# Altium schematic symbol library LATTICEPLDS_Library.SchLib: 291 symbols (part 3 of 32) (continued)
## LC5256/5512/5768-F256 (continued)

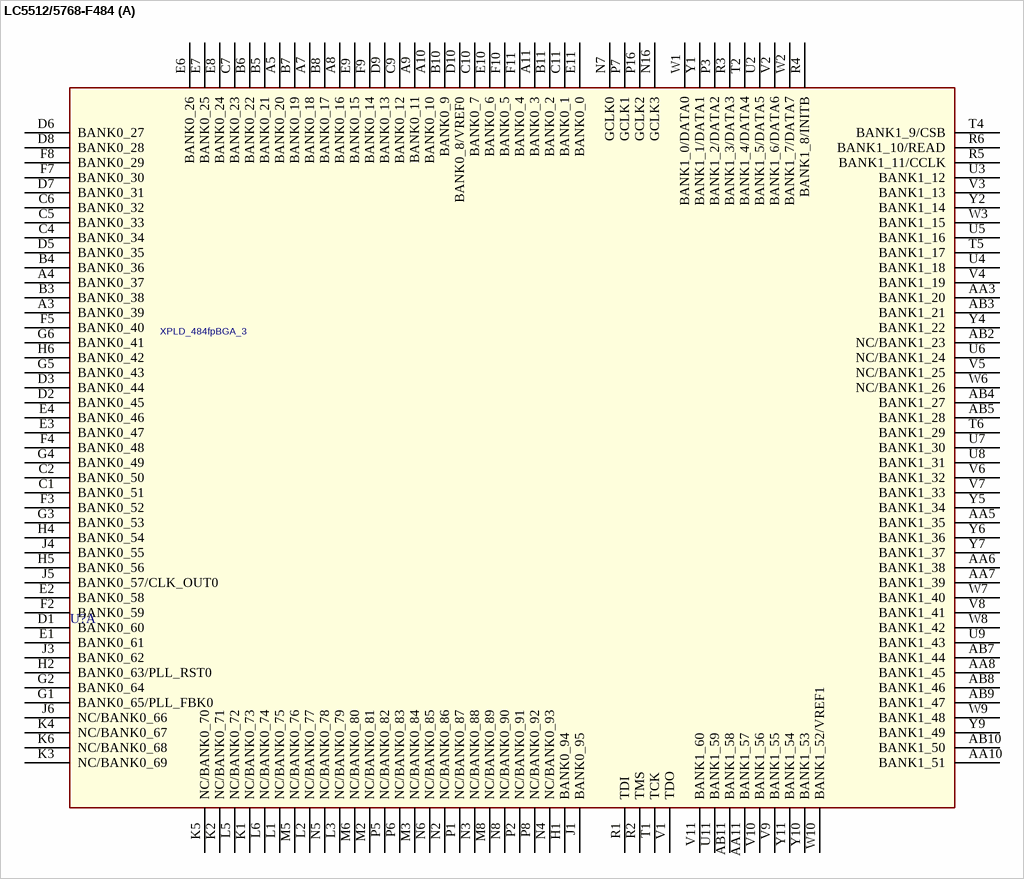
[diagram p31: symbol LC5512/5768-F484]

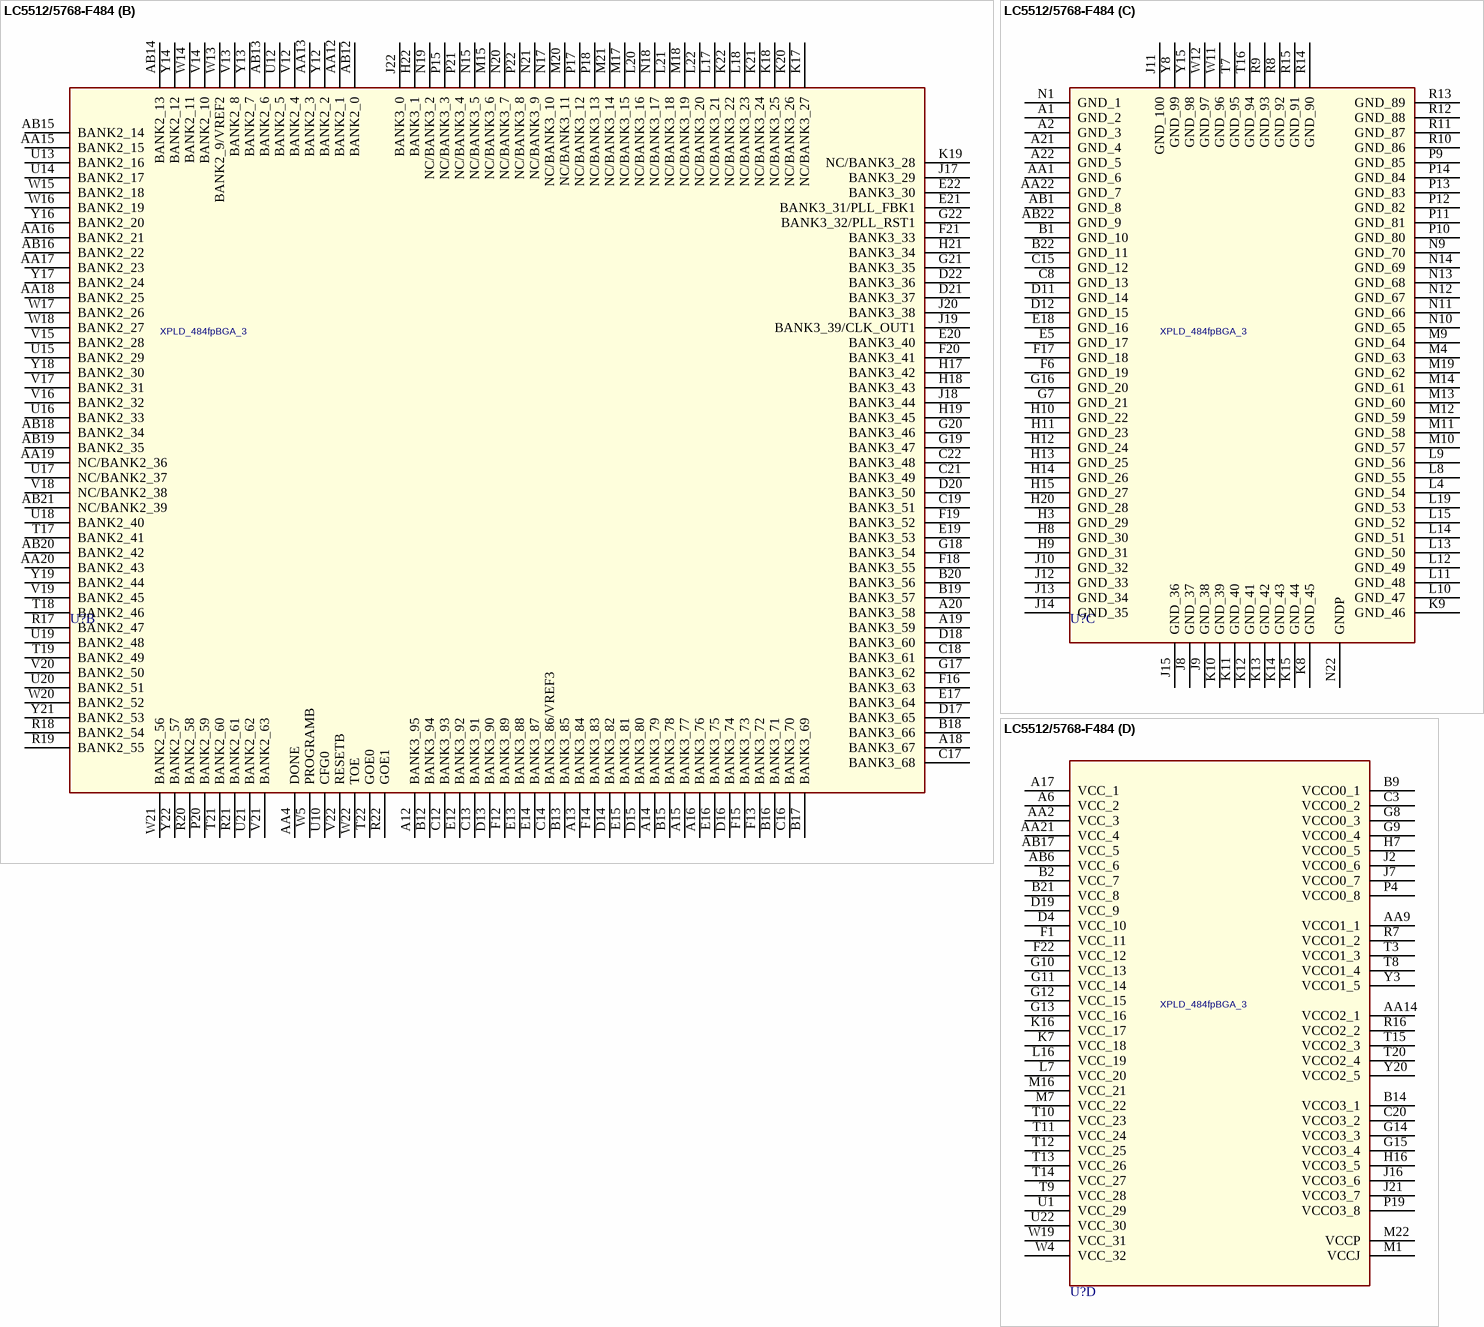
[diagram p32: symbol LC5512/5768-F484]

## LC5512/5768-F484
designator U?, comment XPLD_484fpBGA_3
part A pins: A3 BANK0_39 (hiz), A4 BANK0_37 (hiz), A5 BANK0_20 (hiz), A7 BANK0_18 (hiz), A8 BANK0_16 (hiz), A9 BANK0_11 (hiz), A10 BANK0_10 (hiz), A11 BANK0_3 (hiz), AA3 BANK1_20 (hiz), AA5 BANK1_35 (hiz), AA6 BANK1_38 (hiz), AA7 BANK1_39 (hiz), AA8 BANK1_45 (hiz), AA10 BANK1_51 (hiz), AA11 BANK1_57 (hiz), AB2 NC/BANK1_23 (hiz), AB3 BANK1_21 (hiz), AB4 BANK1_27 (hiz), AB5 BANK1_28 (hiz), AB7 BANK1_44 (hiz), AB8 BANK1_46 (hiz), AB9 BANK1_47 (hiz), AB10 BANK1_50 (hiz), AB11 BANK1_58 (hiz), B3 BANK0_38 (hiz), B4 BANK0_36 (hiz), B5 BANK0_21 (hiz), B6 BANK0_22 (hiz), B7 BANK0_19 (hiz), B8 BANK0_17 (hiz), B10 BANK0_9 (hiz), B11 BANK0_2 (hiz), C1 BANK0_51 (hiz), C2 BANK0_50 (hiz), C4 BANK0_34 (hiz), C5 BANK0_33 (hiz), C6 BANK0_32 (hiz), C7 BANK0_23 (hiz), C9 BANK0_12 (hiz), C10 BANK0_7 (hiz), C11 BANK0_1 (hiz), D1 BANK0_60 (hiz), D2 BANK0_45 (hiz), D3 BANK0_44 (hiz), D5 BANK0_35 (hiz), D6 BANK0_27 (hiz), D7 BANK0_31 (hiz), D8 BANK0_28 (hiz), D9 BANK0_13 (hiz), D10 BANK0_8/VREF0 (hiz), E1 BANK0_61 (hiz), E2 BANK0_58 (hiz), E3 BANK0_47 (hiz), E4 BANK0_46 (hiz), E6 BANK0_26 (hiz), E7 BANK0_25 (hiz), E8 BANK0_24 (hiz), E9 BANK0_15 (hiz), E10 BANK0_6 (hiz), E11 BANK0_0 (hiz), F2 BANK0_59 (hiz), F3 BANK0_52 (hiz), F4 BANK0_48 (hiz), F5 BANK0_40 (hiz), F7 BANK0_30 (hiz), F8 BANK0_29 (hiz), F9 BANK0_14 (hiz), F10 BANK0_5 (hiz), F11 BANK0_4 (hiz), G1 BANK0_65/PLL_FBK0 (hiz), G2 BANK0_64 (hiz), G3 BANK0_53 (hiz), G4 BANK0_49 (hiz), G5 BANK0_43 (hiz), G6 BANK0_41 (hiz), H1 BANK0_94 (hiz), H2 BANK0_63/PLL_RST0 (hiz), H4 BANK0_54 (hiz), H5 BANK0_56 (hiz), H6 BANK0_42 (hiz), J1 BANK0_95 (hiz), J3 BANK0_62 (hiz), J4 BANK0_55 (hiz), J5 BANK0_57/CLK_OUT0 (hiz), J6 NC/BANK0_66 (hiz), K1 NC/BANK0_73 (hiz), K2 NC/BANK0_71 (hiz), K3 NC/BANK0_69 (hiz), K4 NC/BANK0_67 (hiz), K5 NC/BANK0_70 (hiz), K6 NC/BANK0_68 (hiz), L1 NC/BANK0_75 (hiz), L2 NC/BANK0_77 (hiz), L3 NC/BANK0_79 (hiz), L5 NC/BANK0_72 (hiz), L6 NC/BANK0_74 (hiz), M2 NC/BANK0_81 (hiz), M3 NC/BANK0_84 (hiz), M5 NC/BANK0_76 (hiz), M6 NC/BANK0_80 (hiz), M8 NC/BANK0_89 (hiz), N2 NC/BANK0_86 (hiz), N3 NC/BANK0_88 (hiz), N4 NC/BANK0_93 (hiz), N5 NC/BANK0_78 (hiz), N6 NC/BANK0_85 (hiz), N7 GCLK0 (hiz), N8 NC/BANK0_90 (hiz), N16 GCLK3 (hiz), P1 NC/BANK0_87 (hiz), P2 NC/BANK0_91 (hiz), P3 BANK1_2/DATA2 (hiz), P5 NC/BANK0_82 (hiz), P6 NC/BANK0_83 (hiz), P7 GCLK1 (hiz), P8 NC/BANK0_92 (hiz), P16 GCLK2 (hiz), R1 TDI (hiz), R2 TMS (hiz), R3 BANK1_3/DATA3 (hiz), R4 BANK1_8/INITB (hiz), R5 BANK1_11/CCLK (hiz), R6 BANK1_10/READ (hiz), T1 TCK (hiz), T2 BANK1_4/DATA4 (hiz), T4 BANK1_9/CSB (hiz), T5 BANK1_17 (hiz), T6 BANK1_29 (hiz), U2 BANK1_5/DATA5 (hiz), U3 BANK1_12 (hiz), U4 BANK1_18 (hiz), U5 BANK1_16 (hiz), U6 NC/BANK1_24 (hiz), U7 BANK1_30 (hiz), U8 BANK1_31 (hiz), U9 BANK1_43 (hiz), U11 BANK1_59 (hiz), V1 TDO (hiz), V2 BANK1_6/DATA6 (hiz), V3 BANK1_13 (hiz), V4 BANK1_19 (hiz), V5 NC/BANK1_25 (hiz), V6 BANK1_32 (hiz), V7 BANK1_33 (hiz), V8 BANK1_41 (hiz), V9 BANK1_55 (hiz), V10 BANK1_56 (hiz), V11 BANK1_60 (hiz), W1 BANK1_0/DATA0 (hiz), W2 BANK1_7/DATA7 (hiz), W3 BANK1_15 (hiz), W6 NC/BANK1_26 (hiz), W7 BANK1_40 (hiz), W8 BANK1_42 (hiz), W9 BANK1_48 (hiz), W10 BANK1_52/VREF1 (hiz), Y1 BANK1_1/DATA1 (hiz), Y2 BANK1_14 (hiz), Y4 BANK1_22 (hiz), Y5 BANK1_34 (hiz), Y6 BANK1_36 (hiz), Y7 BANK1_37 (hiz), Y9 BANK1_49 (hiz), Y10 BANK1_53 (hiz), Y11 BANK1_54 (hiz)
part B pins: A12 BANK3_95 (hiz), A13 BANK3_84 (hiz), A14 BANK3_79 (hiz), A15 BANK3_77 (hiz), A16 BANK3_76 (hiz), A18 BANK3_67 (hiz), A19 BANK3_59 (hiz), A20 BANK3_58 (hiz), AA4 DONE (hiz), AA12 BANK2_1 (hiz), AA13 BANK2_3 (hiz), AA15 BANK2_15 (hiz), AA16 BANK2_21 (hiz), AA17 BANK2_23 (hiz), AA18 BANK2_25 (hiz), AA19 NC/BANK2_36 (hiz), AA20 BANK2_43 (hiz), AB12 BANK2_0 (hiz), AB13 BANK2_6 (hiz), AB14 BANK2_13 (hiz), AB15 BANK2_14 (hiz), AB16 BANK2_22 (hiz), AB18 BANK2_34 (hiz), AB19 BANK2_35 (hiz), AB20 BANK2_42 (hiz), AB21 NC/BANK2_39 (hiz), B12 BANK3_94 (hiz), B13 BANK3_85 (hiz), B15 BANK3_78 (hiz), B16 BANK3_71 (hiz), B17 BANK3_69 (hiz), B18 BANK3_66 (hiz), B19 BANK3_57 (hiz), B20 BANK3_56 (hiz), C12 BANK3_93 (hiz), C13 BANK3_91 (hiz), C14 BANK3_86/VREF3 (hiz), C16 BANK3_70 (hiz), C17 BANK3_68 (hiz), C18 BANK3_61 (hiz), C19 BANK3_51 (hiz), C21 BANK3_49 (hiz), C22 BANK3_48 (hiz), D13 BANK3_90 (hiz), D14 BANK3_82 (hiz), D15 BANK3_80 (hiz), D16 BANK3_74 (hiz), D17 BANK3_65 (hiz), D18 BANK3_60 (hiz), D20 BANK3_50 (hiz), D21 BANK3_37 (hiz), D22 BANK3_36 (hiz), E12 BANK3_92 (hiz), E13 BANK3_88 (hiz), E14 BANK3_87 (hiz), E15 BANK3_81 (hiz), E16 BANK3_75 (hiz), E17 BANK3_64 (hiz), E19 BANK3_53 (hiz), E20 BANK3_40 (hiz), E21 BANK3_31/PLL_FBK1 (hiz), E22 BANK3_30 (hiz), F12 BANK3_89 (hiz), F13 BANK3_72 (hiz), F14 BANK3_83 (hiz), F15 BANK3_73 (hiz), F16 BANK3_63 (hiz), F18 BANK3_55 (hiz), F19 BANK3_52 (hiz), F20 BANK3_41 (hiz), F21 BANK3_33 (hiz), G17 BANK3_62 (hiz), G18 BANK3_54 (hiz), G19 BANK3_47 (hiz), G20 BANK3_46 (hiz), G21 BANK3_35 (hiz), G22 BANK3_32/PLL_RST1 (hiz), H17 BANK3_42 (hiz), H18 BANK3_43 (hiz), H19 BANK3_45 (hiz), H21 BANK3_34 (hiz), H22 BANK3_1 (hiz), J17 BANK3_29 (hiz), J18 BANK3_44 (hiz), J19 BANK3_39/CLK_OUT1 (hiz), J20 BANK3_38 (hiz), J22 BANK3_0 (hiz), K17 NC/BANK3_27 (hiz), K18 NC/BANK3_25 (hiz), K19 NC/BANK3_28 (hiz), K20 NC/BANK3_26 (hiz), K21 NC/BANK3_24 (hiz), K22 NC/BANK3_22 (hiz), L17 NC/BANK3_21 (hiz), L18 NC/BANK3_23 (hiz), L20 NC/BANK3_16 (hiz), L21 NC/BANK3_18 (hiz), L22 NC/BANK3_20 (hiz), M15 NC/BANK3_6 (hiz), M17 NC/BANK3_15 (hiz), M18 NC/BANK3_19 (hiz), M20 NC/BANK3_11 (hiz), M21 NC/BANK3_14 (hiz), N15 NC/BANK3_5 (hiz), N17 NC/BANK3_10 (hiz), N18 NC/BANK3_17 (hiz), N19 NC/BANK3_2 (hiz), N20 NC/BANK3_7 (hiz), N21 NC/BANK3_9 (hiz), P15 NC/BANK3_3 (hiz), P17 NC/BANK3_12 (hiz), P18 NC/BANK3_13 (hiz), P20 BANK2_59 (hiz), P21 NC/BANK3_4 (hiz), P22 NC/BANK3_8 (hiz), R17 BANK2_47 (hiz), R18 BANK2_54 (hiz), R19 BANK2_55 (hiz), R20 BANK2_58 (hiz), R21 BANK2_61 (hiz), R22 GOE1 (hiz), T17 BANK2_41 (hiz), T18 BANK2_46 (hiz), T19 BANK2_49 (hiz), T21 BANK2_60 (hiz), T22 GOE0 (hiz), U10 CFG0 (hiz), U12 BANK2_5 (hiz), U13 BANK2_16 (hiz), U14 BANK2_17 (hiz), U15 BANK2_29 (hiz), U16 BANK2_33 (hiz), U17 NC/BANK2_37 (hiz), U18 BANK2_40 (hiz), U19 BANK2_48 (hiz), U20 BANK2_51 (hiz), U21 BANK2_62 (hiz), V12 BANK2_4 (hiz), V13 BANK2_8 (hiz), V14 BANK2_10 (hiz), V15 BANK2_28 (hiz), V16 BANK2_32 (hiz), V17 BANK2_31 (hiz), V18 NC/BANK2_38 (hiz), V19 BANK2_45 (hiz), V20 BANK2_50 (hiz), V21 BANK2_63 (hiz), V22 RESETB (hiz), W5 PROGRAMB (hiz), W13 BANK2_9/VREF2 (hiz), W14 BANK2_11 (hiz), W15 BANK2_18 (hiz), W16 BANK2_19 (hiz), W17 BANK2_26 (hiz), W18 BANK2_27 (hiz), W20 BANK2_52 (hiz), W21 BANK2_56 (hiz), W22 TOE (hiz), Y12 BANK2_2 (hiz), Y13 BANK2_7 (hiz), Y14 BANK2_12 (hiz), Y16 BANK2_20 (hiz), Y17 BANK2_24 (hiz), Y18 BANK2_30 (hiz), Y19 BANK2_44 (hiz), Y21 BANK2_53 (hiz), Y22 BANK2_57 (hiz)
part C pins: A1 GND_2 (power), A2 GND_3 (power), A21 GND_4 (power), A22 GND_5 (power), AA1 GND_6 (power), AA22 GND_7 (power), AB1 GND_8 (power), AB22 GND_9 (power), B1 GND_10 (power), B22 GND_11 (power), C8 GND_13 (power), C15 GND_12 (power), D11 GND_14 (power), D12 GND_15 (power), E5 GND_17 (power), E18 GND_16 (power), F6 GND_19 (power), F17 GND_18 (power), G7 GND_21 (power), G16 GND_20 (power), H3 GND_29 (power), H8 GND_30 (power), H9 GND_31 (power), H10 GND_22 (power), H11 GND_23 (power), H12 GND_24 (power), H13 GND_25 (power), H14 GND_26 (power), H15 GND_27 (power), H20 GND_28 (power), J8 GND_37 (power), J9 GND_38 (power), J10 GND_32 (power), J11 GND_100 (power), J12 GND_33 (power), J13 GND_34 (power), J14 GND_35 (power), J15 GND_36 (power), K8 GND_45 (power), K9 GND_46 (power), K10 GND_39 (power), K11 GND_40 (power), K12 GND_41 (power), K13 GND_42 (power), K14 GND_43 (power), K15 GND_44 (power), L4 GND_54 (power), L8 GND_55 (power), L9 GND_56 (power), L10 GND_47 (power), L11 GND_48 (power), L12 GND_49 (power), L13 GND_50 (power), L14 GND_51 (power), L15 GND_52 (power), L19 GND_53 (power), M4 GND_63 (power), M9 GND_64 (power), M10 GND_57 (power), M11 GND_58 (power), M12 GND_59 (power), M13 GND_60 (power), M14 GND_61 (power), M19 GND_62 (power), N1 GND_1 (power), N9 GND_70 (power), N10 GND_65 (power), N11 GND_66 (power), N12 GND_67 (power), N13 GND_68 (power), N14 GND_69 (power), N22 GNDP (power), P9 GND_85 (power), P10 GND_80 (power), P11 GND_81 (power), P12 GND_82 (power), P13 GND_83 (power), P14 GND_84 (power), R8 GND_92 (power), R9 GND_93 (power), R10 GND_86 (power), R11 GND_87 (power), R12 GND_88 (power), R13 GND_89 (power), R14 GND_90 (power), R15 GND_91 (power), T7 GND_95 (power), T16 GND_94 (power), W11 GND_96 (power), W12 GND_97 (power), Y8 GND_99 (power), Y15 GND_98 (power)
part D pins: A6 VCC_2 (power), A17 VCC_1 (power), AA2 VCC_3 (power), AA9 VCCO1_1 (power), AA14 VCCO2_1 (power), AA21 VCC_4 (power), AB6 VCC_6 (power), AB17 VCC_5 (power), B2 VCC_7 (power), B9 VCCO0_1 (power), B14 VCCO3_1 (power), B21 VCC_8 (power), C3 VCCO0_2 (power), C20 VCCO3_2 (power), D4 VCC_10 (power), D19 VCC_9 (power), F1 VCC_11 (power), F22 VCC_12 (power), G8 VCCO0_3 (power), G9 VCCO0_4 (power), G10 VCC_13 (power), G11 VCC_14 (power), G12 VCC_15 (power), G13 VCC_16 (power), G14 VCCO3_3 (power), G15 VCCO3_4 (power), H7 VCCO0_5 (power), H16 VCCO3_5 (power), J2 VCCO0_6 (power), J7 VCCO0_7 (power), J16 VCCO3_6 (power), J21 VCCO3_7 (power), K7 VCC_18 (power), K16 VCC_17 (power), L7 VCC_20 (power), L16 VCC_19 (power), M1 VCCJ (power), M7 VCC_22 (power), M16 VCC_21 (power), M22 VCCP (power), P4 VCCO0_8 (power), P19 VCCO3_8 (power), R7 VCCO1_2 (power), R16 VCCO2_2 (power), T3 VCCO1_3 (power), T8 VCCO1_4 (power), T9 VCC_28 (power), T10 VCC_23 (power), T11 VCC_24 (power), T12 VCC_25 (power), T13 VCC_26 (power), T14 VCC_27 (power), T15 VCCO2_3 (power), T20 VCCO2_4 (power), U1 VCC_29 (power), U22 VCC_30 (power), W4 VCC_32 (power), W19 VCC_31 (power), Y3 VCCO1_5 (power), Y20 VCCO2_5 (power)

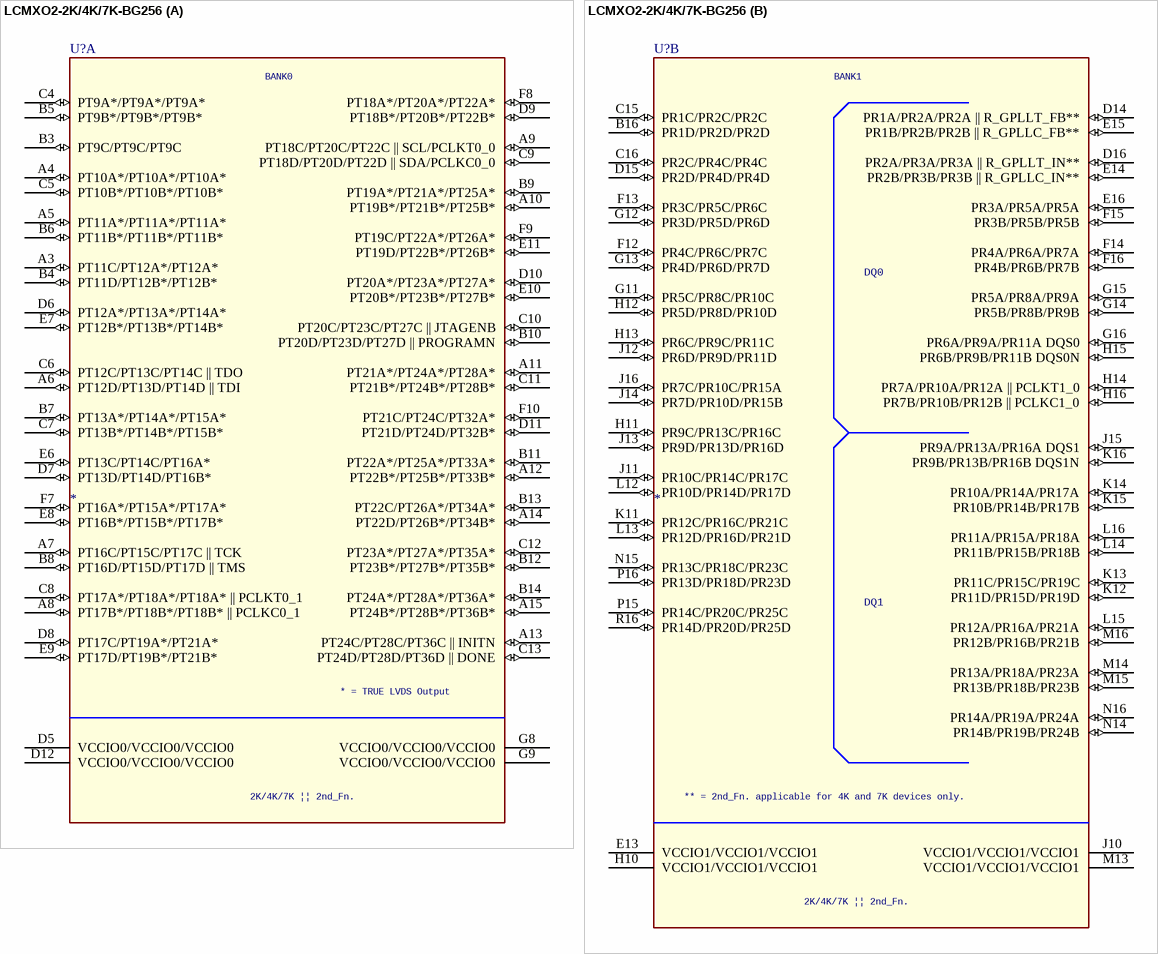
[diagram p33: symbol LCMXO2-2K/4K/7K-BG256]

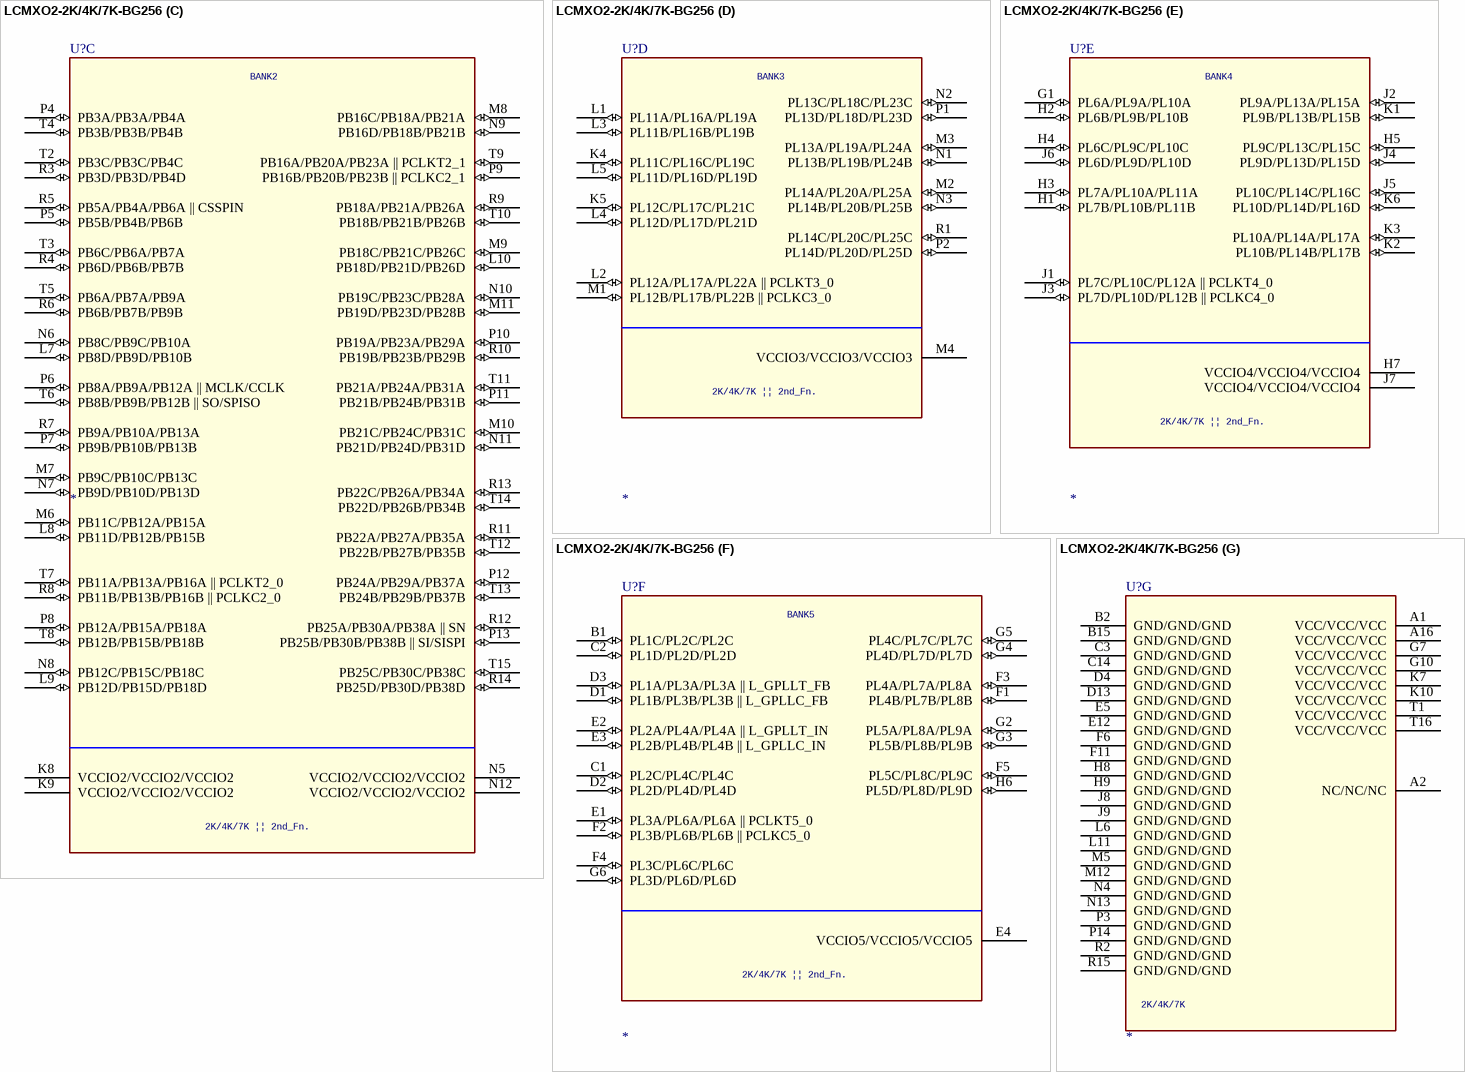
[diagram p34: symbol LCMXO2-2K/4K/7K-BG256]

## LCMXO2-2K/4K/7K-BG256
designator U?
SPLIT_INST: TRUE; SWAP_INFO: (S1+S2+S3+S4+S5+S6+S7)
part A pins: A3 PT11C/PT12A*/PT12A* (io), A4 PT10A*/PT10A*/PT10A* (io), A5 PT11A*/PT11A*/PT11A* (io), A6 PT12D/PT13D/PT14D || TDI (io), A7 PT16C/PT15C/PT17C || TCK (io), A8 PT17B*/PT18B*/PT18B* || PCLKC0_1 (io), A9 PT18C/PT20C/PT22C || SCL/PCLKT0_0 (io), A10 PT19B*/PT21B*/PT25B* (io), A11 PT21A*/PT24A*/PT28A* (io), A12 PT22B*/PT25B*/PT33B* (io), A13 PT24C/PT28C/PT36C || INITN (io), A14 PT22D/PT26B*/PT34B* (io), A15 PT24B*/PT28B*/PT36B* (io), B3 PT9C/PT9C/PT9C (io), B4 PT11D/PT12B*/PT12B* (io), B5 PT9B*/PT9B*/PT9B* (io), B6 PT11B*/PT11B*/PT11B* (io), B7 PT13A*/PT14A*/PT15A* (io), B8 PT16D/PT15D/PT17D || TMS (io), B9 PT19A*/PT21A*/PT25A* (io), B10 PT20D/PT23D/PT27D || PROGRAMN (io), B11 PT22A*/PT25A*/PT33A* (io), B12 PT23B*/PT27B*/PT35B* (io), B13 PT22C/PT26A*/PT34A* (io), B14 PT24A*/PT28A*/PT36A* (io), C4 PT9A*/PT9A*/PT9A* (io), C5 PT10B*/PT10B*/PT10B* (io), C6 PT12C/PT13C/PT14C || TDO (io), C7 PT13B*/PT14B*/PT15B* (io), C8 PT17A*/PT18A*/PT18A* || PCLKT0_1 (io), C9 PT18D/PT20D/PT22D || SDA/PCLKC0_0 (io), C10 PT20C/PT23C/PT27C || JTAGENB (io), C11 PT21B*/PT24B*/PT28B* (io), C12 PT23A*/PT27A*/PT35A* (io), C13 PT24D/PT28D/PT36D || DONE (io), D5 VCCIO0/VCCIO0/VCCIO0 (power), D6 PT12A*/PT13A*/PT14A* (io), D7 PT13D/PT14D/PT16B* (io), D8 PT17C/PT19A*/PT21A* (io), D9 PT18B*/PT20B*/PT22B* (io), D10 PT20A*/PT23A*/PT27A* (io), D11 PT21D/PT24D/PT32B* (io), D12 VCCIO0/VCCIO0/VCCIO0 (power), E6 PT13C/PT14C/PT16A* (io), E7 PT12B*/PT13B*/PT14B* (io), E8 PT16B*/PT15B*/PT17B* (io), E9 PT17D/PT19B*/PT21B* (io), E10 PT20B*/PT23B*/PT27B* (io), E11 PT19D/PT22B*/PT26B* (io), F7 PT16A*/PT15A*/PT17A* (io), F8 PT18A*/PT20A*/PT22A* (io), F9 PT19C/PT22A*/PT26A* (io), F10 PT21C/PT24C/PT32A* (io), G8 VCCIO0/VCCIO0/VCCIO0 (power), G9 VCCIO0/VCCIO0/VCCIO0 (power)
part B pins: B16 PR1D/PR2D/PR2D (io), C15 PR1C/PR2C/PR2C (io), C16 PR2C/PR4C/PR4C (io), D14 PR1A/PR2A/PR2A || R_GPLLT_FB** (io), D15 PR2D/PR4D/PR4D (io), D16 PR2A/PR3A/PR3A || R_GPLLT_IN** (io), E13 VCCIO1/VCCIO1/VCCIO1 (power), E14 PR2B/PR3B/PR3B || R_GPLLC_IN** (io), E15 PR1B/PR2B/PR2B || R_GPLLC_FB** (io), E16 PR3A/PR5A/PR5A (io), F12 PR4C/PR6C/PR7C (io), F13 PR3C/PR5C/PR6C (io), F14 PR4A/PR6A/PR7A (io), F15 PR3B/PR5B/PR5B (io), F16 PR4B/PR6B/PR7B (io), G11 PR5C/PR8C/PR10C (io), G12 PR3D/PR5D/PR6D (io), G13 PR4D/PR6D/PR7D (io), G14 PR5B/PR8B/PR9B (io), G15 PR5A/PR8A/PR9A (io), G16 PR6A/PR9A/PR11A DQS0 (io), H10 VCCIO1/VCCIO1/VCCIO1 (power), H11 PR9C/PR13C/PR16C (io), H12 PR5D/PR8D/PR10D (io), H13 PR6C/PR9C/PR11C (io), H14 PR7A/PR10A/PR12A || PCLKT1_0 (io), H15 PR6B/PR9B/PR11B DQS0N (io), H16 PR7B/PR10B/PR12B || PCLKC1_0 (io), J10 VCCIO1/VCCIO1/VCCIO1 (power), J11 PR10C/PR14C/PR17C (io), J12 PR6D/PR9D/PR11D (io), J13 PR9D/PR13D/PR16D (io), J14 PR7D/PR10D/PR15B (io), J15 PR9A/PR13A/PR16A DQS1 (io), J16 PR7C/PR10C/PR15A (io), K11 PR12C/PR16C/PR21C (io), K12 PR11D/PR15D/PR19D (io), K13 PR11C/PR15C/PR19C (io), K14 PR10A/PR14A/PR17A (io), K15 PR10B/PR14B/PR17B (io), K16 PR9B/PR13B/PR16B DQS1N (io), L12 PR10D/PR14D/PR17D (io), L13 PR12D/PR16D/PR21D (io), L14 PR11B/PR15B/PR18B (io), L15 PR12A/PR16A/PR21A (io), L16 PR11A/PR15A/PR18A (io), M13 VCCIO1/VCCIO1/VCCIO1 (power), M14 PR13A/PR18A/PR23A (io), M15 PR13B/PR18B/PR23B (io), M16 PR12B/PR16B/PR21B (io), N14 PR14B/PR19B/PR24B (io), N15 PR13C/PR18C/PR23C (io), N16 PR14A/PR19A/PR24A (io), P15 PR14C/PR20C/PR25C (io), P16 PR13D/PR18D/PR23D (io), R16 PR14D/PR20D/PR25D (io)
part C pins: K8 VCCIO2/VCCIO2/VCCIO2 (power), K9 VCCIO2/VCCIO2/VCCIO2 (power), L7 PB8D/PB9D/PB10B (io), L8 PB11D/PB12B/PB15B (io), L9 PB12D/PB15D/PB18D (io), L10 PB18D/PB21D/PB26D (io), M6 PB11C/PB12A/PB15A (io), M7 PB9C/PB10C/PB13C (io), M8 PB16C/PB18A/PB21A (io), M9 PB18C/PB21C/PB26C (io), M10 PB21C/PB24C/PB31C (io), M11 PB19D/PB23D/PB28B (io), N5 VCCIO2/VCCIO2/VCCIO2 (power), N6 PB8C/PB9C/PB10A (io), N7 PB9D/PB10D/PB13D (io), N8 PB12C/PB15C/PB18C (io), N9 PB16D/PB18B/PB21B (io), N10 PB19C/PB23C/PB28A (io), N11 PB21D/PB24D/PB31D (io), N12 VCCIO2/VCCIO2/VCCIO2 (power), P4 PB3A/PB3A/PB4A (io), P5 PB5B/PB4B/PB6B (io), P6 PB8A/PB9A/PB12A || MCLK/CCLK (io), P7 PB9B/PB10B/PB13B (io), P8 PB12A/PB15A/PB18A (io), P9 PB16B/PB20B/PB23B || PCLKC2_1 (io), P10 PB19A/PB23A/PB29A (io), P11 PB21B/PB24B/PB31B (io), P12 PB24A/PB29A/PB37A (io), P13 PB25B/PB30B/PB38B || SI/SISPI (io), R3 PB3D/PB3D/PB4D (io), R4 PB6D/PB6B/PB7B (io), R5 PB5A/PB4A/PB6A || CSSPIN (io), R6 PB6B/PB7B/PB9B (io), R7 PB9A/PB10A/PB13A (io), R8 PB11B/PB13B/PB16B || PCLKC2_0 (io), R9 PB18A/PB21A/PB26A (io), R10 PB19B/PB23B/PB29B (io), R11 PB22A/PB27A/PB35A (io), R12 PB25A/PB30A/PB38A || SN (io), R13 PB22C/PB26A/PB34A (io), R14 PB25D/PB30D/PB38D (io), T2 PB3C/PB3C/PB4C (io), T3 PB6C/PB6A/PB7A (io), T4 PB3B/PB3B/PB4B (io), T5 PB6A/PB7A/PB9A (io), T6 PB8B/PB9B/PB12B || SO/SPISO (io), T7 PB11A/PB13A/PB16A || PCLKT2_0 (io), T8 PB12B/PB15B/PB18B (io), T9 PB16A/PB20A/PB23A || PCLKT2_1 (io), T10 PB18B/PB21B/PB26B (io), T11 PB21A/PB24A/PB31A (io), T12 PB22B/PB27B/PB35B (io), T13 PB24B/PB29B/PB37B (io), T14 PB22D/PB26B/PB34B (io), T15 PB25C/PB30C/PB38C (io)
part D pins: K4 PL11C/PL16C/PL19C (io), K5 PL12C/PL17C/PL21C (io), L1 PL11A/PL16A/PL19A (io), L2 PL12A/PL17A/PL22A || PCLKT3_0 (io), L3 PL11B/PL16B/PL19B (io), L4 PL12D/PL17D/PL21D (io), L5 PL11D/PL16D/PL19D (io), M1 PL12B/PL17B/PL22B || PCLKC3_0 (io), M2 PL14A/PL20A/PL25A (io), M3 PL13A/PL19A/PL24A (io), M4 VCCIO3/VCCIO3/VCCIO3 (power), N1 PL13B/PL19B/PL24B (io), N2 PL13C/PL18C/PL23C (io), N3 PL14B/PL20B/PL25B (io), P1 PL13D/PL18D/PL23D (io), P2 PL14D/PL20D/PL25D (io), R1 PL14C/PL20C/PL25C (io)
part E pins: G1 PL6A/PL9A/PL10A (io), H1 PL7B/PL10B/PL11B (io), H2 PL6B/PL9B/PL10B (io), H3 PL7A/PL10A/PL11A (io), H4 PL6C/PL9C/PL10C (io), H5 PL9C/PL13C/PL15C (io), H7 VCCIO4/VCCIO4/VCCIO4 (power), J1 PL7C/PL10C/PL12A || PCLKT4_0 (io), J2 PL9A/PL13A/PL15A (io), J3 PL7D/PL10D/PL12B || PCLKC4_0 (io), J4 PL9D/PL13D/PL15D (io), J5 PL10C/PL14C/PL16C (io), J6 PL6D/PL9D/PL10D (io), J7 VCCIO4/VCCIO4/VCCIO4 (power), K1 PL9B/PL13B/PL15B (io), K2 PL10B/PL14B/PL17B (io), K3 PL10A/PL14A/PL17A (io), K6 PL10D/PL14D/PL16D (io)
part F pins: B1 PL1C/PL2C/PL2C (io), C1 PL2C/PL4C/PL4C (io), C2 PL1D/PL2D/PL2D (io), D1 PL1B/PL3B/PL3B || L_GPLLC_FB (io), D2 PL2D/PL4D/PL4D (io), D3 PL1A/PL3A/PL3A || L_GPLLT_FB (io), E1 PL3A/PL6A/PL6A || PCLKT5_0 (io), E2 PL2A/PL4A/PL4A || L_GPLLT_IN (io), E3 PL2B/PL4B/PL4B || L_GPLLC_IN (io), E4 VCCIO5/VCCIO5/VCCIO5 (power), F1 PL4B/PL7B/PL8B (io), F2 PL3B/PL6B/PL6B || PCLKC5_0 (io), F3 PL4A/PL7A/PL8A (io), F4 PL3C/PL6C/PL6C (io), F5 PL5C/PL8C/PL9C (io), G2 PL5A/PL8A/PL9A (io), G3 PL5B/PL8B/PL9B (io), G4 PL4D/PL7D/PL7D (io), G5 PL4C/PL7C/PL7C (io), G6 PL3D/PL6D/PL6D (io), H6 PL5D/PL8D/PL9D (io)
part G pins: A1 VCC/VCC/VCC (power), A2 NC/NC/NC, A16 VCC/VCC/VCC (power), B2 GND/GND/GND (power), B15 GND/GND/GND (power), C3 GND/GND/GND (power), C14 GND/GND/GND (power), D4 GND/GND/GND (power), D13 GND/GND/GND (power), E5 GND/GND/GND (power), E12 GND/GND/GND (power), F6 GND/GND/GND (power), F11 GND/GND/GND (power), G7 VCC/VCC/VCC (power), G10 VCC/VCC/VCC (power), H8 GND/GND/GND (power), H9 GND/GND/GND (power), J8 GND/GND/GND (power), J9 GND/GND/GND (power), K7 VCC/VCC/VCC (power), K10 VCC/VCC/VCC (power), L6 GND/GND/GND (power), L11 GND/GND/GND (power), M5 GND/GND/GND (power), M12 GND/GND/GND (power), N4 GND/GND/GND (power), N13 GND/GND/GND (power), P3 GND/GND/GND (power), P14 GND/GND/GND (power), R2 GND/GND/GND (power), R15 GND/GND/GND (power), T1 VCC/VCC/VCC (power), T16 VCC/VCC/VCC (power)
part A text: BANK0; * = TRUE LVDS Output; 2K/4K/7K || 2nd_Fn.
part B text: BANK1; DQ0; DQ1; ** = 2nd_Fn. applicable for 4K and 7K devices only.; 2K/4K/7K || 2nd_Fn.
part C text: BANK2; 2K/4K/7K || 2nd_Fn.
part D text: BANK3; 2K/4K/7K || 2nd_Fn.
part E text: BANK4; 2K/4K/7K || 2nd_Fn.
part F text: BANK5; 2K/4K/7K || 2nd_Fn.
part G text: 2K/4K/7K

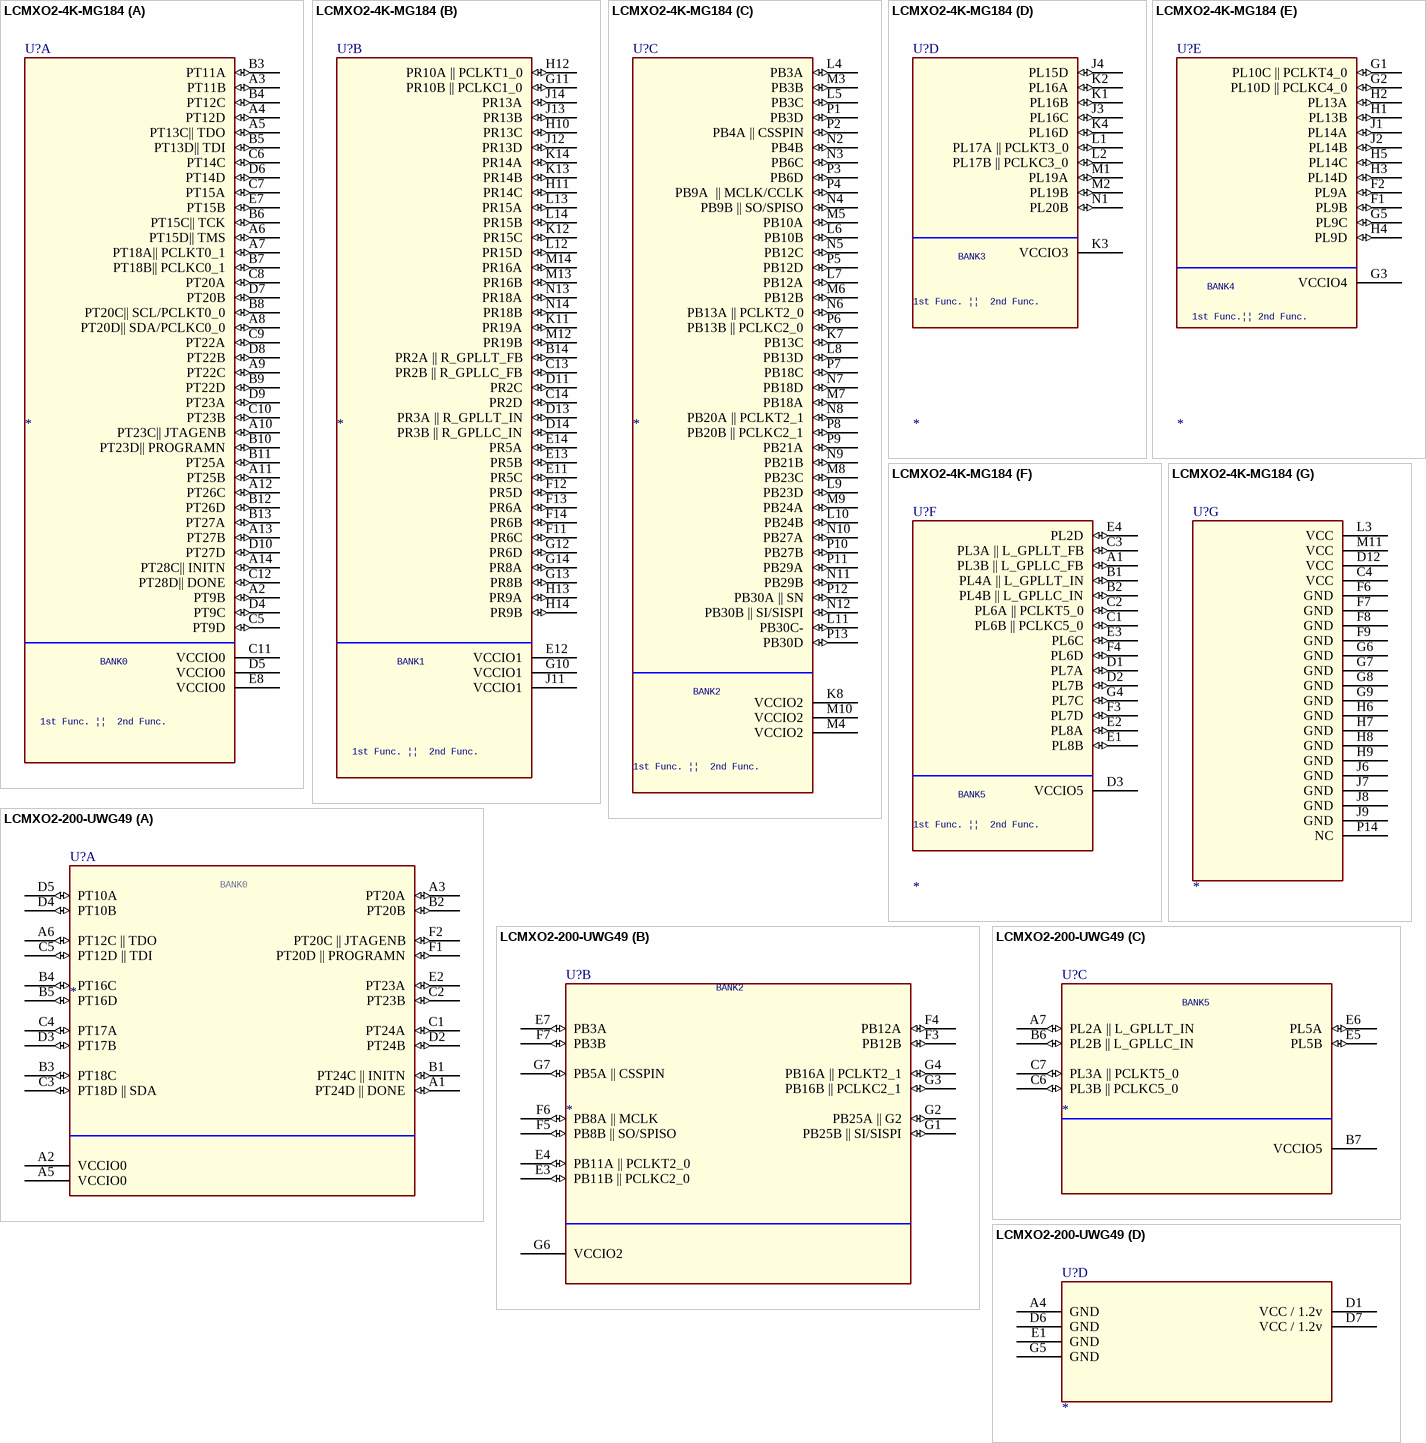
[diagram p35: symbols LCMXO2-4K-MG184 to LCMXO2-200-UWG49]